# Altium footprint library SMT.PcbLib: 151 footprints (part 5 of 10)
Each footprint in its own frame and in the unit in brackets; x right, y up, seen from the top. Pads: shape width x height; smd on the part's side, far side on the other; paste and mask are expansions set on the pad; w line width, h text height; cw(c..) or ccw(c..) is an arc to the next point about the centre after c.
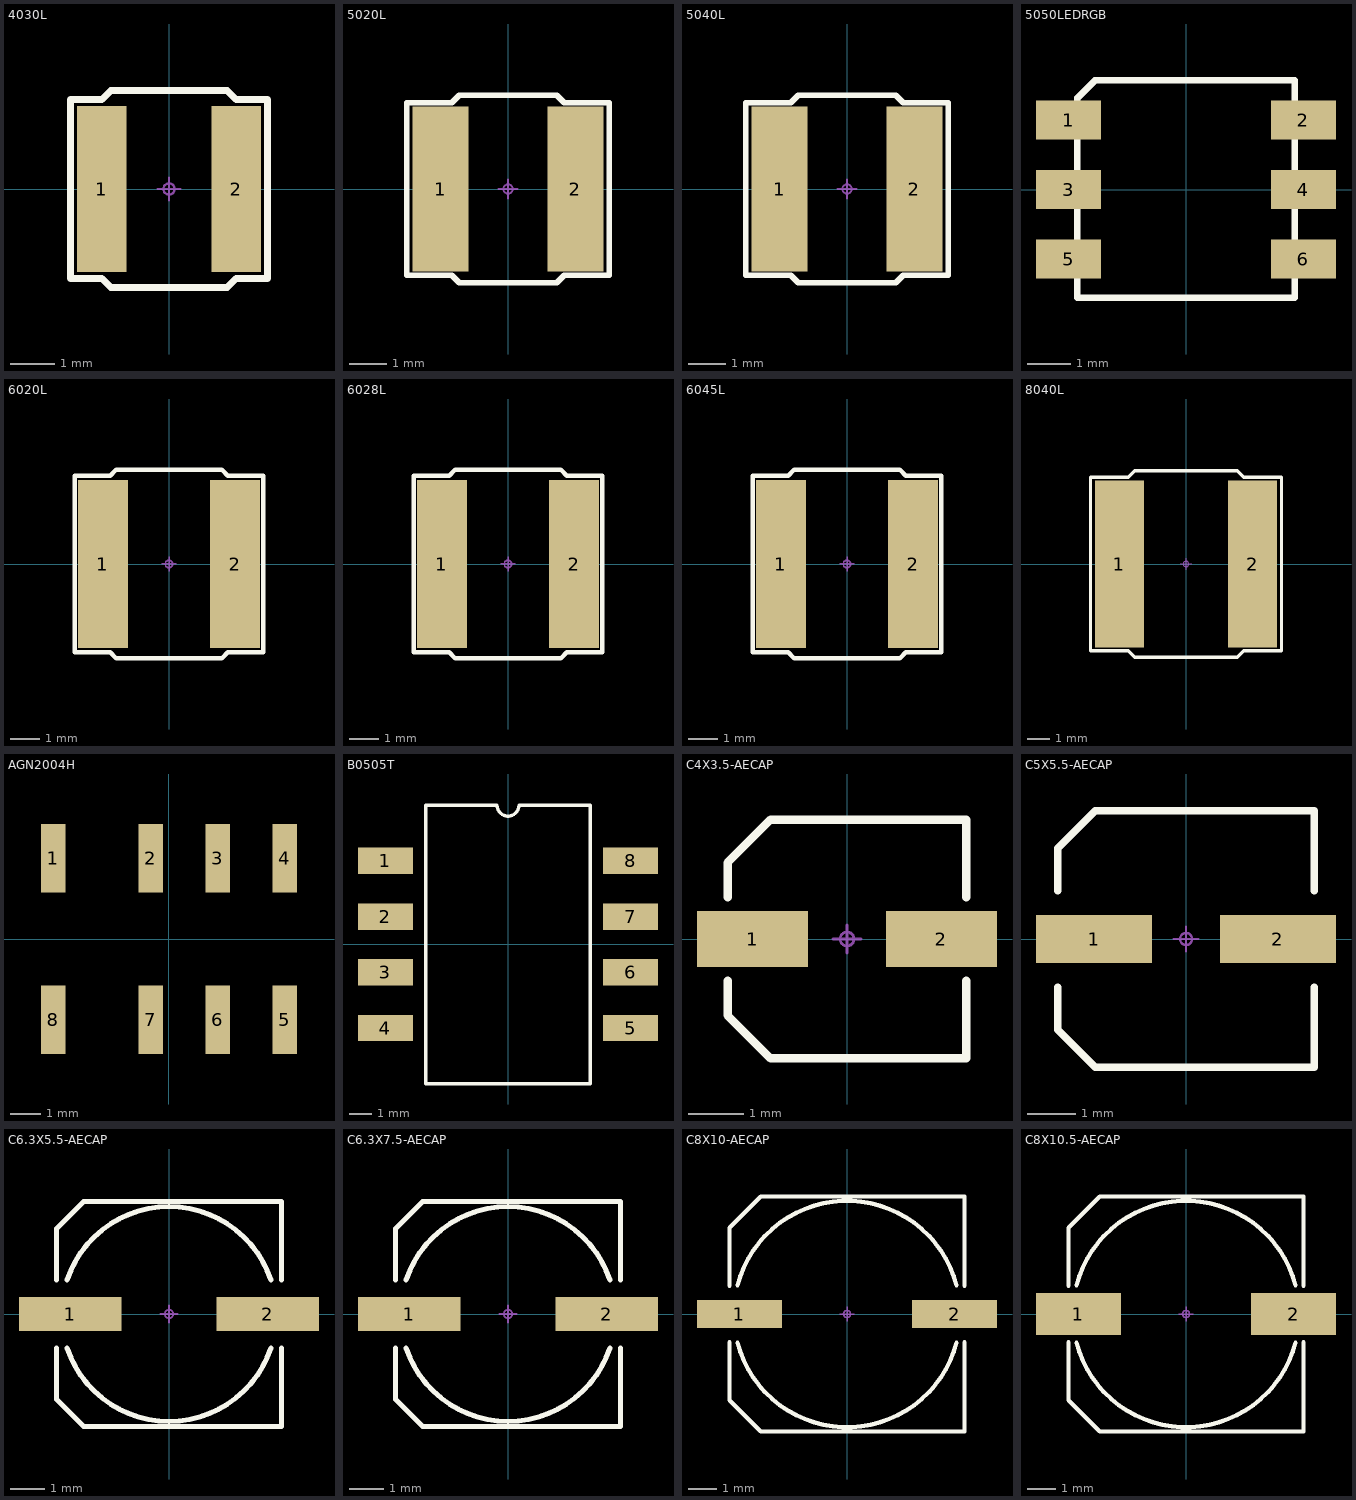
[diagram p4: the footprints below, top view; thin cyan lines are the x and y axes]

## 4030L [mm]
height 3.1
pads (2):
  rect 1.1x3.7 smd mask+0.051: 1(-1.5,0) 2(1.5,0)
Top Overlay:
  lines w0.152: -2.2,-2 -1.5,-2 -1.3,-2.2 1.3,-2.2 1.5,-2 2.2,-2 2.2,2 1.5,2 1.3,2.2 -1.3,2.2 -1.5,2 -2.2,2 -2.2,-2
Mechanical 15:
  circle w0.05: c0,0 r0.125
  lines w0.05: -0.25,0 0.25,0 ; 0,-0.25 0,0.25
3D body "swpa4030s.stp": height 3, standoff -0.02, extent -2,-2 2,2

## 5020L [mm]
height 3.1
pads (2):
  rect 1.5x4.4 smd mask+0.051: 1(-1.8,0) 2(1.8,0)
Top Overlay:
  lines w0.152: -2.7,-2.3 -1.5,-2.3 -1.3,-2.5 1.3,-2.5 1.5,-2.3 2.7,-2.3 2.7,2.3 1.5,2.3 1.3,2.5 -1.3,2.5 -1.5,2.3 -2.7,2.3 -2.7,-2.3
Mechanical 15:
  circle w0.05: c0,0 r0.125
  lines w0.05: -0.25,0 0.25,0 ; 0,-0.25 0,0.25
3D body "swpa5020s.stp": height 2, standoff -0.02, extent -2.5,-2.5 2.5,2.5

## 5040L [mm]
height 3.1
pads (2):
  rect 1.5x4.4 smd mask+0.051: 1(-1.8,0) 2(1.8,0)
Top Overlay:
  lines w0.152: -2.7,-2.3 -1.5,-2.3 -1.3,-2.5 1.3,-2.5 1.5,-2.3 2.7,-2.3 2.7,2.3 1.5,2.3 1.3,2.5 -1.3,2.5 -1.5,2.3 -2.7,2.3 -2.7,-2.3
Mechanical 15:
  circle w0.05: c0,0 r0.125
  lines w0.05: -0.25,0 0.25,0 ; 0,-0.25 0,0.25
3D body "swpa5040s.stp": height 4, standoff -0.02, extent -2.5,-2.5 2.5,2.5

## 5050LEDRGB [mm]
pads (6):
  rect 1.5x0.9 smd: 1(-2.705,1.6) 2(2.705,1.6) 3(-2.705,0) 4(2.705,0) 5(-2.705,-1.6) 6(2.705,-1.6)
Top Overlay:
  lines w0.152: -2.019,2.515 2.502,2.515 2.502,-2.489 -2.502,-2.489 -2.502,2.108 -2.095,2.515 -1.714,2.515
3D body "User Library-smd_led_5050.step": height 1.6, standoff 0, extent -2.632,-2.475 2.668,2.525

## 6020L [mm]
height 3.1
pads (2):
  rect 1.7x5.7 smd mask+0.051: 1(-2.25,0) 2(2.25,0)
Top Overlay:
  lines w0.152: -3.2,-3 -3.2,3 -2,3 -1.8,3.2 1.8,3.2 2,3 3.2,3 3.2,-3 2,-3 1.8,-3.2 -1.8,-3.2 -2,-3 -3.2,-3
Mechanical 15:
  circle w0.05: c0,0 r0.125
  lines w0.05: -0.25,0 0.25,0 ; 0,-0.25 0,0.25
3D body "swpa6020s.stp": height 2, standoff -0.03, extent -3,-2.975 3,2.975

## 6028L [mm]
height 3.1
pads (2):
  rect 1.7x5.7 smd mask+0.051: 1(-2.25,0) 2(2.25,0)
Top Overlay:
  lines w0.152: -3.2,-3 -2,-3 -1.8,-3.2 1.8,-3.2 2,-3 3.2,-3 3.2,3 2,3 1.8,3.2 -1.8,3.2 -2,3 -3.2,3 -3.2,-3
Mechanical 15:
  circle w0.05: c0,0 r0.125
  lines w0.05: -0.25,0 0.25,0 ; 0,-0.25 0,0.25
3D body "swpa6028s.stp": height 2.8, standoff -0.03, extent -2.95,-3 3,3

## 6045L [mm]
height 3.1
pads (2):
  rect 1.7x5.7 smd mask+0.051: 1(-2.25,0) 2(2.25,0)
Top Overlay:
  lines w0.152: -3.2,-3 -3.2,3 -2,3 -1.8,3.2 1.8,3.2 2,3 3.2,3 3.2,-3 2,-3 1.8,-3.2 -1.8,-3.2 -2,-3 -3.2,-3
Mechanical 15:
  circle w0.05: c0,0 r0.125
  lines w0.05: -0.25,0 0.25,0 ; 0,-0.25 0,0.25
3D body "swpa6045s.stp": height 4.5, standoff -0.03, extent -3,-3 3,2.95

## 8040L [mm]
height 3.1
pads (2):
  rect 2.2x7.5 smd mask+0.051: 1(-3,0) 2(3,0)
Top Overlay:
  lines w0.152: -4.3,-3.9 -4.3,3.9 -2.6,3.9 -2.3,4.2 2.3,4.2 2.6,3.9 4.3,3.9 4.3,-3.9 2.6,-3.9 2.3,-4.2 -2.3,-4.2 -2.6,-3.9 -4.3,-3.9
Mechanical 15:
  circle w0.05: c0,0 r0.125
  lines w0.05: -0.25,0 0.25,0 ; 0,-0.25 0,0.25
3D body "swpa8040s.stp": height 4, standoff -0.04, extent -4,-4 4,4

## AGN2004H [mm]
pads (8):
  rect 0.8x2.25 smd: 1(-3.8,2.65) 2(-0.6,2.65) 3(1.6,2.65) 4(3.8,2.65) 5(3.8,-2.65) 6(1.6,-2.65) 7(-0.6,-2.65) 8(-3.8,-2.65)
3D body "agn2004.stp": height 10.1, standoff -0.02, extent -5.29,-3.683 5.31,3.717
3D body "p080-225.stp": height 0, standoff 0, extent -4.2,-3.775 -3.4,-1.525
3D body "p080-225.stp": height 0, standoff 0, extent -1,-3.775 -0.2,-1.525
3D body "p080-225.stp": height 0, standoff 0, extent 1.2,-3.775 2,-1.525
3D body "p080-225.stp": height 0, standoff 0, extent 3.4,-3.775 4.2,-1.525
3D body "p080-225.stp": height 0, standoff 0, extent 3.4,1.525 4.2,3.775
3D body "p080-225.stp": height 0, standoff 0, extent 1.2,1.525 2,3.775
3D body "p080-225.stp": height 0, standoff 0, extent -1,1.525 -0.2,3.775
3D body "p080-225.stp": height 0, standoff 0, extent -4.2,1.525 -3.4,3.775

## B0505T [mm]
pads (8):
  rect 2.5x1.2 smd: 1(-5.588,3.81) 2(-5.588,1.27) 3(-5.588,-1.27) 4(-5.588,-3.81) 5(5.588,-3.81) 6(5.588,-1.27) 7(5.588,1.27) 8(5.588,3.81)
Top Overlay:
  lines w0.152: -3.75,-6.35 3.75,-6.35 3.75,6.35 0.5,6.35 cw(c0,6.35) -0.5,6.35 -3.75,6.35 -3.75,-6.35

## C4X3.5-AECAP [mm]
pads (2):
  rect 2x1 smd: 1(-1.7,0) 2(1.7,0)
Top Overlay:
  lines w0.152: -2.15,-0.75 -2.15,-1.375 -1.375,-2.15 2.15,-2.15 2.15,-0.75 ; -2.15,0.75 -2.15,1.375 -1.375,2.15 2.15,2.15 2.15,0.75
Mechanical 15:
  circle w0.05: c0,0 r0.125
  lines w0.05: -0.25,0 0.25,0 ; 0,-0.25 0,0.25
3D body "3d_4x5_3-aecap.stp": height 5.81, standoff 0, extent -2.4,-2.15 2.4,2.15

## C5X5.5-AECAP [mm]
pads (2):
  rect 2.4x1 smd: 1(-1.9,0) 2(1.9,0)
Top Overlay:
  lines w0.152: -2.65,-1 -2.65,-1.875 -1.875,-2.65 2.65,-2.65 2.65,-1 ; -2.65,1 -2.65,1.875 -1.875,2.65 2.65,2.65 2.65,1
Mechanical 15:
  circle w0.05: c0,0 r0.125
  lines w0.05: -0.25,0 0.25,0 ; 0,-0.25 0,0.25
3D body "3d_5x5_3-aecap.stp": height 5.66, standoff 0, extent -2.7,-2.65 2.7,2.65

## C6.3X5.5-AECAP [mm]
pads (2):
  rect 3x1 smd: 1(-2.9,0) 2(2.9,0)
Top Overlay:
  lines w0.152: -3.3,-1 -3.3,-2.5 -2.5,-3.3 3.3,-3.3 3.3,-1 ; -3.3,1 -3.3,2.5 -2.5,3.3 3.3,3.3 3.3,1 ; -2.988,-0.996 ccw(c0,0) 2.988,-0.996 ; -2.988,0.996 cw(c0,0) 2.988,0.996
Mechanical 15:
  circle w0.05: c0,0 r0.125
  lines w0.05: -0.25,0 0.25,0 ; 0,-0.25 0,0.25
3D body "3d_6_3x5_3-aecap.stp": height 5.3, standoff 0, extent -4.1,-3.3 4.1,3.3

## C6.3X7.5-AECAP [mm]
pads (2):
  rect 3x1 smd: 1(-2.9,0) 2(2.9,0)
Top Overlay:
  lines w0.152: -3.3,-1 -3.3,-2.5 -2.5,-3.3 3.3,-3.3 3.3,-1 ; -3.3,1 -3.3,2.5 -2.5,3.3 3.3,3.3 3.3,1 ; -2.988,-0.996 ccw(c0,0) 2.988,-0.996 ; -2.988,0.996 cw(c0,0) 2.988,0.996
Mechanical 15:
  circle w0.05: c0,0 r0.125
  lines w0.05: -0.25,0 0.25,0 ; 0,-0.25 0,0.25
3D body "3d_6_3x7_7-aecap.stp": height 7.7, standoff 0, extent -4.1,-3.3 4.1,3.3

## C8X10-AECAP [mm]
pads (2):
  rect 3x1 smd: 1(-3.8,0) 2(3.8,0)
Top Overlay:
  lines w0.152: -4.15,-1 -4.15,-3.05 -3.05,-4.15 4.15,-4.15 4.15,-1 ; -4.15,1 -4.15,3.05 -3.05,4.15 4.15,4.15 4.15,1 ; -3.868,-1.018 ccw(c0,0) 3.868,-1.018 ; -3.868,1.018 cw(c0,0) 3.868,1.018
Mechanical 15:
  circle w0.05: c0,0 r0.125
  lines w0.05: -0.25,0 0.25,0 ; 0,-0.25 0,0.25
3D body "3d_8x10-aecap.stp": height 10, standoff 0, extent -4.95,-4.2 4.95,4.2

## C8X10.5-AECAP [mm]
pads (2):
  rect 3x1.5 smd: 1(-3.8,0) 2(3.8,0)
Top Overlay:
  lines w0.152: -4.15,-1 -4.15,-3.05 -3.05,-4.15 4.15,-4.15 4.15,-1 ; -4.15,1 -4.15,3.05 -3.05,4.15 4.15,4.15 4.15,1 ; -3.868,-1.018 ccw(c0,0) 3.868,-1.018 ; -3.868,1.018 cw(c0,0) 3.868,1.018
Mechanical 15:
  circle w0.05: c0,0 r0.125
  lines w0.05: -0.25,0 0.25,0 ; 0,-0.25 0,0.25
3D body "3d_8x10_3-aecap.stp": height 10.3, standoff 0, extent -4.95,-4.2 4.95,4.2